# Altium footprint library PcbLib_ICs.PcbLib: 317 footprints (part 22 of 24)
Each footprint in its own frame and in the unit in brackets; x right, y up, seen from the top. Pads: shape width x height; smd on the part's side, far side on the other; paste and mask are expansions set on the pad; w line width, h text height; cw(c..) or ccw(c..) is an arc to the next point about the centre after c.
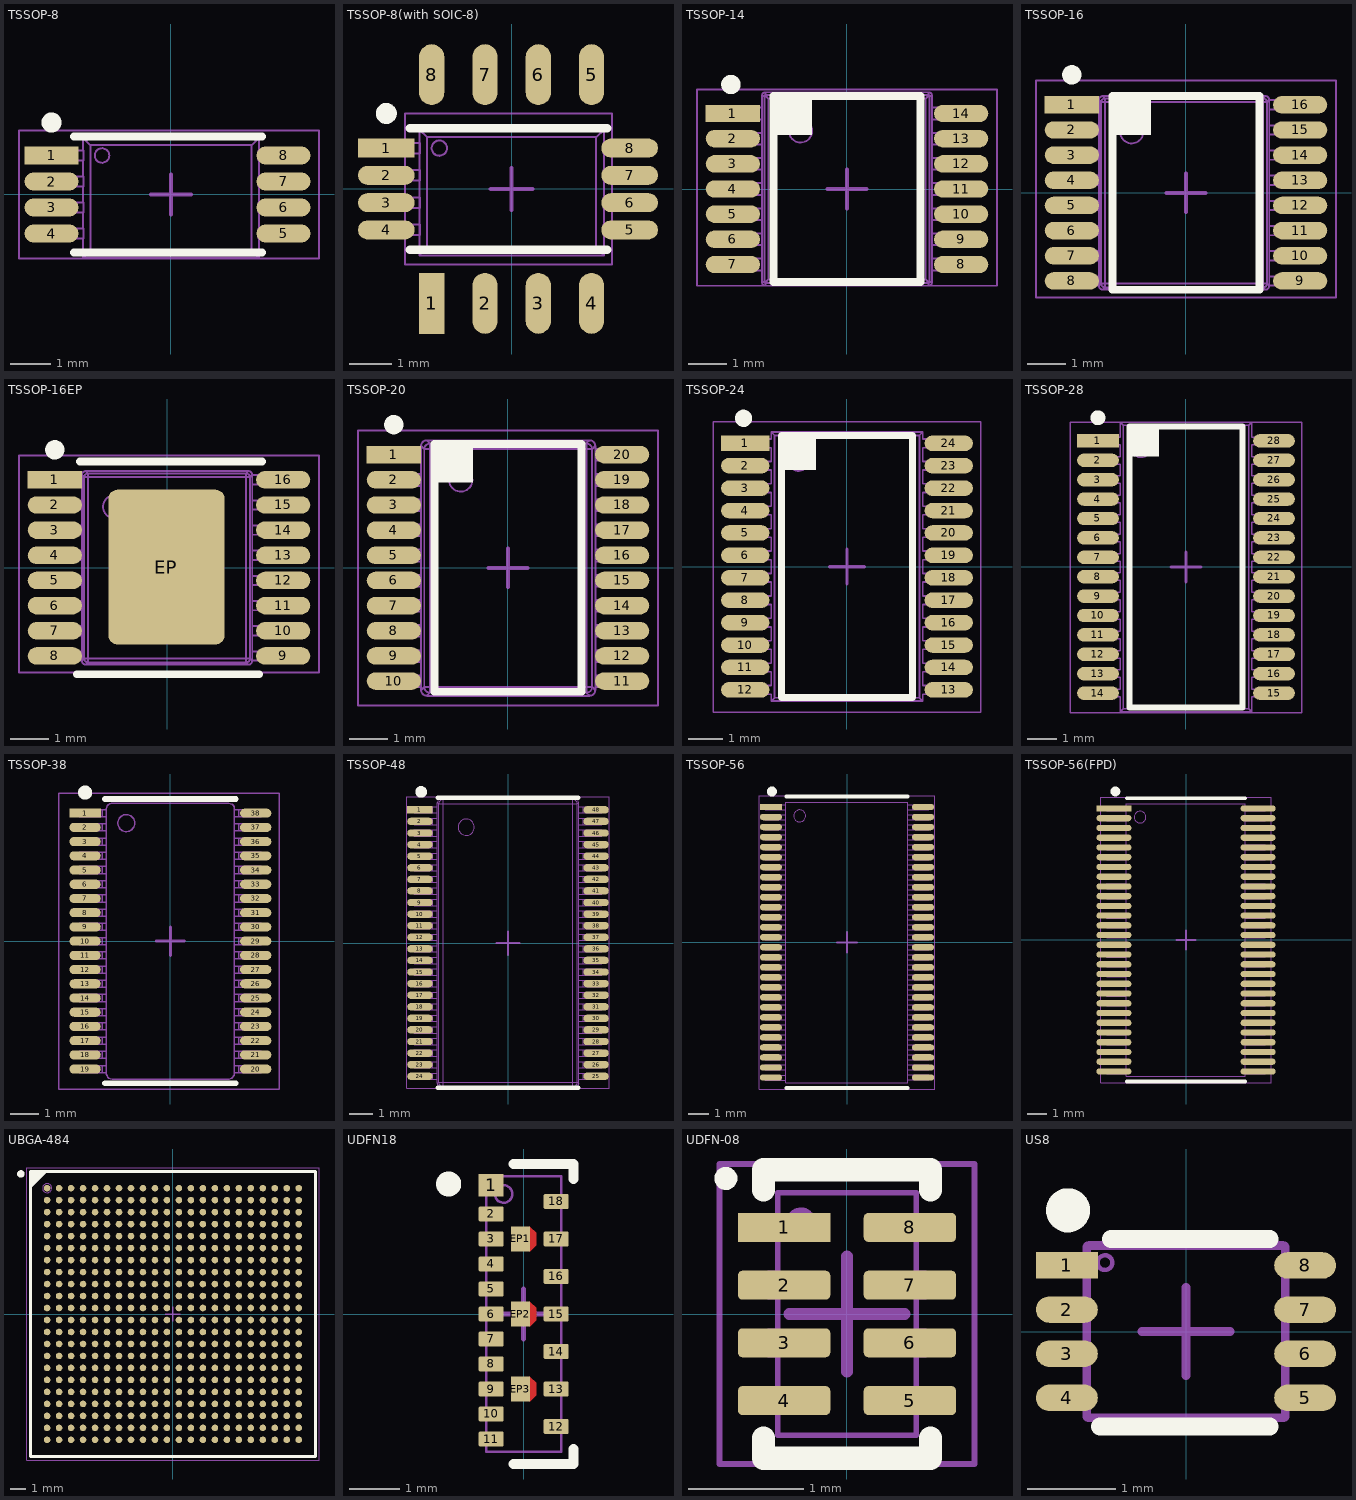
[diagram p21: the footprints below, top view; thin cyan lines are the x and y axes]

## TSSOP-8 [mm] "TSOP, 8-Leads, Body 3,00x3,00mm, Pitch 0,65mm, IPC Medium Density"
height 1.1
pads (8):
  rect 1.35x0.45 smd paste+0 mask+0.05: 1(-2.987,0.975)
  oval 1.35x0.45 smd paste+0 mask+0.05: 2(-2.987,0.325) 3(-2.987,-0.325) 4(-2.987,-0.975) 5(2.813,-0.975) 6(2.813,-0.325) 7(2.813,0.325) 8(2.813,0.975)
Top Overlay:
  circle w0.25: c-2.987,1.8 r0.125
  lines w0.2: -2.425,-1.45 2.275,-1.45 ; -2.425,1.45 2.275,1.45
Top Assy:
  circle w0.05: c-1.725,0.975 r0.182
  lines w0.05: -2.2,-1.1 -2.2,-1.581 ; -2.2,-0.85 -2.2,-0.45 ; -2.2,-0.2 -2.2,0.2 ; -2.2,0.45 -2.2,0.85 ; -2.2,1.1 -2.2,1.419 ; 2.2,-1.1 2.2,-1.581 ; 2.2,-0.85 2.2,-0.45 ; 2.2,-0.2 2.2,0.2 ; 2.2,0.45 2.2,0.85 ; 2.2,1.1 2.2,1.419 ; -2.718,-1.1 -2.718,-0.85 ; -2.718,-1.1 -3.14,-1.1 -3.14,-0.85 -2.718,-0.85 ; -2.718,-1.1 -2.642,-1.1 ; -2.718,-0.85 -2.642,-0.85 ; -2.718,-0.45 -2.718,-0.2 ; -2.718,-0.45 -3.14,-0.45 -3.14,-0.2 -2.718,-0.2 ; -2.718,-0.45 -2.642,-0.45 ; -2.718,-0.2 -2.642,-0.2 ; -2.718,0.2 -2.718,0.45 ; -2.718,0.2 -3.14,0.2 -3.14,0.45 -2.718,0.45 ; -2.718,0.2 -2.642,0.2 ; -2.718,0.45 -2.642,0.45 ; -2.718,0.85 -2.718,1.1 ; -2.718,0.85 -3.14,0.85 -3.14,1.1 -2.718,1.1 ; -2.718,0.85 -2.642,0.85 ; -2.718,1.1 -2.642,1.1 ; -2.642,-1.1 -2.642,-0.85 ; -2.642,-1.1 -2.362,-1.1 ; -2.642,-0.85 -2.362,-0.85 ; -2.642,-0.45 -2.362,-0.45 ; -2.642,-0.45 -2.642,-0.2 ; -2.642,-0.2 -2.362,-0.2 ; -2.642,0.2 -2.362,0.2 ; -2.642,0.2 -2.642,0.45 ; -2.642,0.45 -2.362,0.45 ; -2.642,0.85 -2.642,1.1 ; -2.642,0.85 -2.362,0.85 ; -2.642,1.1 -2.362,1.1 ; -2.362,-1.1 -2.362,-0.85 ; -2.362,-1.1 -2.191,-1.1 -2.191,-0.85 -2.362,-0.85 ; -2.362,-0.45 -2.362,-0.2 ; -2.362,-0.45 -2.191,-0.45 -2.191,-0.2 -2.362,-0.2 ; -2.362,0.2 -2.362,0.45 ; -2.362,0.2 -2.191,0.2 -2.191,0.45 -2.362,0.45 ; -2.362,0.85 -2.362,1.1 ; -2.362,0.85 -2.191,0.85 -2.191,1.1 -2.362,1.1 ; -2.2,-1.581 -2.015,-1.396 ; -2.2,-1.581 2.2,-1.581 ; -2.2,1.419 2.2,1.419 ; -2.2,1.419 -2.015,1.235 ; -2.015,-1.396 -2.015,1.235 ; -2.015,-1.396 2.015,-1.396 ; -2.015,1.235 2.015,1.235 ; 2.015,-1.396 2.015,1.235 ; 2.015,-1.396 2.2,-1.581 ; 2.015,1.235 2.2,1.419 ; 2.362,-1.1 2.362,-0.85 ; 2.362,-1.1 2.642,-1.1 ; 2.362,-1.1 2.191,-1.1 2.191,-0.85 2.362,-0.85 ; 2.362,-0.85 2.642,-0.85 ; 2.362,-0.45 2.362,-0.2 ; 2.362,-0.45 2.642,-0.45 ; 2.362,-0.45 2.191,-0.45 2.191,-0.2 2.362,-0.2 ; 2.362,-0.2 2.642,-0.2 ; 2.362,0.2 2.362,0.45 ; 2.362,0.2 2.642,0.2 ; 2.362,0.2 2.191,0.2 2.191,0.45 2.362,0.45 ; 2.362,0.45 2.642,0.45 ; 2.362,0.85 2.362,1.1 ; 2.362,0.85 2.191,0.85 2.191,1.1 2.362,1.1 ; 2.362,0.85 2.642,0.85 ; 2.362,1.1 2.642,1.1 ; 2.642,-1.1 2.718,-1.1 ; 2.642,-1.1 2.642,-0.85 ; 2.642,-0.85 2.718,-0.85 ; 2.642,-0.45 2.718,-0.45 ; 2.642,-0.45 2.642,-0.2 ; 2.642,-0.2 2.718,-0.2 ; 2.642,0.2 2.718,0.2 ; 2.642,0.2 2.642,0.45 ; 2.642,0.45 2.718,0.45 ; 2.642,0.85 2.718,0.85 ; 2.642,0.85 2.642,1.1 ; 2.642,1.1 2.718,1.1 ; 2.718,-1.1 2.718,-0.85 ; 2.718,-1.1 3.14,-1.1 3.14,-0.85 2.718,-0.85 ; 2.718,-0.45 2.718,-0.2 ; 2.718,-0.45 3.14,-0.45 3.14,-0.2 2.718,-0.2 ; 2.718,0.2 2.718,0.45 ; 2.718,0.2 3.14,0.2 3.14,0.45 2.718,0.45 ; 2.718,0.85 2.718,1.1 ; 2.718,0.85 3.14,0.85 3.14,1.1 2.718,1.1
  text ".Designator" at -2.579,-0.349 h1.5
Top Text:
  lines w0.05: -3.8,-1.6 -3.8,1.6 3.7,1.6 3.7,-1.6 -3.8,-1.6
  lines w0.1: -0.5,0 0.5,0 ; 0,-0.5 0,0.5
3D body "TSSOP-08.stp": height 1.11, standoff 0.01, extent -3.316,-1.249 3.114,1.25

## TSSOP-8(with SOIC-8) [mm] "TSOP, 8-Leads, Body 3,00x3,00mm, Pitch 0,65mm, IPC Medium Density"
height 1.1
pads (16):
  rect 1.35x0.45 smd paste+0 mask+0.05: 1(-2.987,0.975)
  rect 0.6x1.45 smd paste+0 mask+0.05: 1(-1.905,-2.725)
  oval 1.35x0.45 smd paste+0 mask+0.05: 2(-2.987,0.325) 3(-2.987,-0.325) 4(-2.987,-0.975) 5(2.813,-0.975) 6(2.813,-0.325) 7(2.813,0.325) 8(2.813,0.975)
  oval 0.6x1.45 smd paste+0 mask+0.05: 2(-0.635,-2.725) 3(0.635,-2.725) 4(1.905,-2.725) 5(1.905,2.725) 6(0.635,2.725) 7(-0.635,2.725) 8(-1.905,2.725)
Top Overlay:
  circle w0.25: c-2.987,1.8 r0.125
  lines w0.2: -2.425,-1.45 2.275,-1.45 ; -2.425,1.45 2.275,1.45
Top Assy:
  circle w0.05: c-1.725,0.975 r0.182
  lines w0.05: -2.2,-1.1 -2.2,-1.581 ; -2.2,-0.85 -2.2,-0.45 ; -2.2,-0.2 -2.2,0.2 ; -2.2,0.45 -2.2,0.85 ; -2.2,1.1 -2.2,1.419 ; 2.2,-1.1 2.2,-1.581 ; 2.2,-0.85 2.2,-0.45 ; 2.2,-0.2 2.2,0.2 ; 2.2,0.45 2.2,0.85 ; 2.2,1.1 2.2,1.419 ; -2.718,-1.1 -2.718,-0.85 ; -2.718,-1.1 -3.14,-1.1 -3.14,-0.85 -2.718,-0.85 ; -2.718,-1.1 -2.642,-1.1 ; -2.718,-0.85 -2.642,-0.85 ; -2.718,-0.45 -2.718,-0.2 ; -2.718,-0.45 -3.14,-0.45 -3.14,-0.2 -2.718,-0.2 ; -2.718,-0.45 -2.642,-0.45 ; -2.718,-0.2 -2.642,-0.2 ; -2.718,0.2 -2.718,0.45 ; -2.718,0.2 -3.14,0.2 -3.14,0.45 -2.718,0.45 ; -2.718,0.2 -2.642,0.2 ; -2.718,0.45 -2.642,0.45 ; -2.718,0.85 -2.718,1.1 ; -2.718,0.85 -3.14,0.85 -3.14,1.1 -2.718,1.1 ; -2.718,0.85 -2.642,0.85 ; -2.718,1.1 -2.642,1.1 ; -2.642,-1.1 -2.642,-0.85 ; -2.642,-1.1 -2.362,-1.1 ; -2.642,-0.85 -2.362,-0.85 ; -2.642,-0.45 -2.362,-0.45 ; -2.642,-0.45 -2.642,-0.2 ; -2.642,-0.2 -2.362,-0.2 ; -2.642,0.2 -2.362,0.2 ; -2.642,0.2 -2.642,0.45 ; -2.642,0.45 -2.362,0.45 ; -2.642,0.85 -2.642,1.1 ; -2.642,0.85 -2.362,0.85 ; -2.642,1.1 -2.362,1.1 ; -2.362,-1.1 -2.362,-0.85 ; -2.362,-1.1 -2.191,-1.1 -2.191,-0.85 -2.362,-0.85 ; -2.362,-0.45 -2.362,-0.2 ; -2.362,-0.45 -2.191,-0.45 -2.191,-0.2 -2.362,-0.2 ; -2.362,0.2 -2.362,0.45 ; -2.362,0.2 -2.191,0.2 -2.191,0.45 -2.362,0.45 ; -2.362,0.85 -2.362,1.1 ; -2.362,0.85 -2.191,0.85 -2.191,1.1 -2.362,1.1 ; -2.2,-1.581 -2.015,-1.396 ; -2.2,-1.581 2.2,-1.581 ; -2.2,1.419 2.2,1.419 ; -2.2,1.419 -2.015,1.235 ; -2.015,-1.396 -2.015,1.235 ; -2.015,-1.396 2.015,-1.396 ; -2.015,1.235 2.015,1.235 ; 2.015,-1.396 2.015,1.235 ; 2.015,-1.396 2.2,-1.581 ; 2.015,1.235 2.2,1.419 ; 2.362,-1.1 2.362,-0.85 ; 2.362,-1.1 2.642,-1.1 ; 2.362,-1.1 2.191,-1.1 2.191,-0.85 2.362,-0.85 ; 2.362,-0.85 2.642,-0.85 ; 2.362,-0.45 2.362,-0.2 ; 2.362,-0.45 2.642,-0.45 ; 2.362,-0.45 2.191,-0.45 2.191,-0.2 2.362,-0.2 ; 2.362,-0.2 2.642,-0.2 ; 2.362,0.2 2.362,0.45 ; 2.362,0.2 2.642,0.2 ; 2.362,0.2 2.191,0.2 2.191,0.45 2.362,0.45 ; 2.362,0.45 2.642,0.45 ; 2.362,0.85 2.362,1.1 ; 2.362,0.85 2.191,0.85 2.191,1.1 2.362,1.1 ; 2.362,0.85 2.642,0.85 ; 2.362,1.1 2.642,1.1 ; 2.642,-1.1 2.718,-1.1 ; 2.642,-1.1 2.642,-0.85 ; 2.642,-0.85 2.718,-0.85 ; 2.642,-0.45 2.718,-0.45 ; 2.642,-0.45 2.642,-0.2 ; 2.642,-0.2 2.718,-0.2 ; 2.642,0.2 2.718,0.2 ; 2.642,0.2 2.642,0.45 ; 2.642,0.45 2.718,0.45 ; 2.642,0.85 2.718,0.85 ; 2.642,0.85 2.642,1.1 ; 2.642,1.1 2.718,1.1 ; 2.718,-1.1 2.718,-0.85 ; 2.718,-1.1 3.14,-1.1 3.14,-0.85 2.718,-0.85 ; 2.718,-0.45 2.718,-0.2 ; 2.718,-0.45 3.14,-0.45 3.14,-0.2 2.718,-0.2 ; 2.718,0.2 2.718,0.45 ; 2.718,0.2 3.14,0.2 3.14,0.45 2.718,0.45 ; 2.718,0.85 2.718,1.1 ; 2.718,0.85 3.14,0.85 3.14,1.1 2.718,1.1
  text ".Designator" at -2.579,-0.349 h1.5
Top Text:
  lines w0.05: -2.54,-1.8 2.388,-1.8 2.388,1.8 -2.54,1.8 -2.54,-1.8
  lines w0.1: -0.5,0 0.5,0 ; 0,-0.5 0,0.5
3D body "TSSOP-08.stp": height 1.11, standoff 0.01, extent -3.316,-1.249 3.114,1.25

## TSSOP-14 [mm] "TSOP, 20-Leads, Body 6.50x4.40mm, Pitch 0.65mm, IPC Medium Density"
height 1.1
pads (14):
  rect 1.4x0.45 smd paste+0 mask+0.05: 1(-2.95,1.95)
  oval 1.4x0.45 smd paste+0 mask+0.05: 2(-2.95,1.3) 3(-2.95,0.65) 4(-2.95,0) 5(-2.95,-0.65) 6(-2.95,-1.3) 7(-2.95,-1.95) 8(2.95,-1.95) 9(2.95,-1.3) 10(2.95,-0.65) 11(2.95,0) 12(2.95,0.65) 13(2.95,1.3) 14(2.95,1.95)
Top Overlay:
  circle w0.25: c-3,2.7 r0.125
  region: -0.9,2.4 -1.9,2.4 -1.9,1.4 -0.9,1.4
  lines w0.2: -1.9,-2.4 1.9,-2.4 1.9,2.4 -1.9,2.4 -1.9,-2.4
Top Assy:
  drawing of 226 lines, arcs and shapes, not listed
  text ".Designator" at 0.467,-3.443 h2
Top Text:
  lines w0.05: -3.875,-2.5 3.875,-2.5 3.875,2.575 -3.875,2.575 -3.875,-2.5
  lines w0.1: -0.5,0 0.5,0 ; 0,-0.5 0,0.5
3D body "TSSOP-14.stp": height 1.11, standoff 0.01, extent -3.215,-2.225 3.216,2.225

## TSSOP-16 [mm] "TSOP, 20-Leads, Body 6.50x4.40mm, Pitch 0.65mm, IPC Medium Density"
height 1.1
pads (16):
  rect 1.4x0.45 smd paste+0 mask+0.05: 1(-2.95,2.275)
  oval 1.4x0.45 smd paste+0 mask+0.05: 2(-2.95,1.625) 3(-2.95,0.975) 4(-2.95,0.325) 5(-2.95,-0.325) 6(-2.95,-0.975) 7(-2.95,-1.625) 8(-2.95,-2.275) 9(2.95,-2.275) 10(2.95,-1.625) 11(2.95,-0.975) 12(2.95,-0.325) 13(2.95,0.325) 14(2.95,0.975) 15(2.95,1.625) 16(2.95,2.275)
Top Overlay:
  circle w0.25: c-2.95,3.05 r0.125
  region: -0.9,2.5 -1.9,2.5 -1.9,1.5 -0.9,1.5
  lines w0.2: -1.9,-2.5 1.9,-2.5 1.9,2.5 -1.9,2.5 -1.9,-2.5
Top Assy:
  drawing of 271 lines, arcs and shapes, not listed
  text ".Designator" at 0.467,-3.443 h2
Top Text:
  lines w0.05: -3.875,-2.7 3.875,-2.7 3.875,2.9 -3.875,2.9 -3.875,-2.7
  lines w0.1: -0.5,0 0.5,0 ; 0,-0.5 0,0.5
3D body "TSSOP-16.stp": height 1.11, standoff 0.01, extent -3.19,-2.55 3.241,2.55

## TSSOP-16EP [mm] "TSOP, 20-Leads, Body 6.50x4.40mm, Pitch 0.65mm, IPC Medium Density"
height 1.1
pads (17):
  rect 1.4x0.45 smd paste+0 mask+0.05: 1(-2.9,2.275)
  oval 1.4x0.45 smd paste+0 mask+0.05: 2(-2.9,1.625) 3(-2.9,0.975) 4(-2.9,0.325) 5(-2.9,-0.325) 6(-2.9,-0.975) 7(-2.9,-1.625) 8(-2.9,-2.275) 9(3,-2.275) 10(3,-1.625) 11(3,-0.975) 12(3,-0.325) 13(3,0.325) 14(3,0.975) 15(3,1.625) 16(3,2.275)
  rrect15% 3x4 smd paste-50 mask+0.05: EP(-0.015,0.02)
Top Overlay:
  circle w0.25: c-2.9,3.05 r0.125
  lines w0.2: -2.325,-2.75 2.375,-2.75 ; -2.25,2.75 2.45,2.75
Top Paste:
  region: 0.1,0.6 0.1,0.1 0.6,0.1 0.6,0.6
  region: -0.6,0.6 -0.6,0.1 -0.1,0.1 -0.1,0.6
  region: -0.1,-0.6 -0.1,-0.1 -0.6,-0.1 -0.6,-0.6
  region: 0.6,-0.6 0.6,-0.1 0.1,-0.1 0.1,-0.6
  region: -1.3,0.6 -1.3,0.1 -0.8,0.1 -0.8,0.6
  region: -0.8,-0.6 -0.8,-0.1 -1.3,-0.1 -1.3,-0.6
  region: 1.3,-0.6 1.3,-0.1 0.8,-0.1 0.8,-0.6
  region: 0.8,0.6 0.8,0.1 1.3,0.1 1.3,0.6
  region: 0.1,1.3 0.1,0.8 0.6,0.8 0.6,1.3
  region: -0.6,1.3 -0.6,0.8 -0.1,0.8 -0.1,1.3
  region: -1.3,1.3 -1.3,0.8 -0.8,0.8 -0.8,1.3
  region: 0.8,1.3 0.8,0.8 1.3,0.8 1.3,1.3
  region: 0.1,2 0.1,1.5 0.6,1.5 0.6,2
  region: -0.6,2 -0.6,1.5 -0.1,1.5 -0.1,2
  region: -1.3,2 -1.3,1.5 -0.8,1.5 -0.8,2
  region: 0.8,2 0.8,1.5 1.3,1.5 1.3,2
  region: -0.1,-1.3 -0.1,-0.8 -0.6,-0.8 -0.6,-1.3
  region: 0.6,-1.3 0.6,-0.8 0.1,-0.8 0.1,-1.3
  region: 1.3,-1.3 1.3,-0.8 0.8,-0.8 0.8,-1.3
  region: -0.8,-1.3 -0.8,-0.8 -1.3,-0.8 -1.3,-1.3
  region: -0.1,-2 -0.1,-1.5 -0.6,-1.5 -0.6,-2
  region: 0.6,-2 0.6,-1.5 0.1,-1.5 0.1,-2
  region: 1.3,-2 1.3,-1.5 0.8,-1.5 0.8,-2
  region: -0.8,-2 -0.8,-1.5 -1.3,-1.5 -1.3,-2
Top Assy:
  drawing of 271 lines, arcs and shapes, not listed
  text ".Designator" at 0.467,-3.443 h2
Top Text:
  lines w0.05: -3.825,-2.7 3.925,-2.7 3.925,2.9 -3.825,2.9 -3.825,-2.7
  lines w0.1: -0.5,0 0.5,0 ; 0,-0.5 0,0.5
3D body "User Library-AS3933-BTST.step": height 1.06, standoff -0.01, extent -3.175,-2.55 3.325,2.55

## TSSOP-20 [mm] "TSOP, 20-Leads, Body 6.50x4.40mm, Pitch 0.65mm, IPC Medium Density"
height 1.1
pads (20):
  rect 1.4x0.45 smd paste+0 mask+0.05: 1(-2.95,2.925)
  oval 1.4x0.45 smd paste+0 mask+0.05: 2(-2.95,2.275) 3(-2.95,1.625) 4(-2.95,0.975) 5(-2.95,0.325) 6(-2.95,-0.325) 7(-2.95,-0.975) 8(-2.95,-1.625) 9(-2.95,-2.275) 10(-2.95,-2.925) 11(2.95,-2.925) 12(2.95,-2.275) 13(2.95,-1.625) 14(2.95,-0.975) 15(2.95,-0.325) 16(2.95,0.325) 17(2.95,0.975) 18(2.95,1.625) 19(2.95,2.275) 20(2.95,2.925)
Top Overlay:
  circle w0.25: c-2.95,3.7 r0.125
  region: -0.9,3.2 -1.9,3.2 -1.9,2.2 -0.9,2.2
  lines w0.2: -1.9,-3.2 -1.9,3.2 1.9,3.2 1.9,-3.2 -1.9,-3.2
Top Assy:
  drawing of 315 lines, arcs and shapes, not listed
  text ".Designator" at 0.349,-2.579 h1.5
Top Text:
  lines w0.05: -3.875,-3.55 3.875,-3.55 3.875,3.55 -3.875,3.55 -3.875,-3.55
  lines w0.1: -0.5,0 0.5,0 ; 0,-0.5 0,0.5
3D body "TSSOP-20.stp": height 1.11, standoff 0.01, extent -3.215,-3.2 3.216,3.2

## TSSOP-24 [mm] "TSOP, 24-Leads, Pitch 0.65mm, IPC Medium Density"
height 1.1
pads (24):
  rect 1.4x0.45 smd paste+0 mask+0.05: 1(-2.95,3.575)
  oval 1.4x0.45 smd paste+0 mask+0.05: 2(-2.95,2.925) 3(-2.95,2.275) 4(-2.95,1.625) 5(-2.95,0.975) 6(-2.95,0.325) 7(-2.95,-0.325) 8(-2.95,-0.975) 9(-2.95,-1.625) 10(-2.95,-2.275) 11(-2.95,-2.925) 12(-2.95,-3.575) 13(2.95,-3.575) 14(2.95,-2.925) 15(2.95,-2.275) 16(2.95,-1.625) 17(2.95,-0.975) 18(2.95,-0.325) 19(2.95,0.325) 20(2.95,0.975) 21(2.95,1.625) 22(2.95,2.275) 23(2.95,2.925) 24(2.95,3.575)
Top Overlay:
  circle w0.25: c-3,4.3 r0.125
  region: -0.9,3.8 -1.9,3.8 -1.9,2.8 -0.9,2.8
  lines w0.2: -1.9,-3.8 1.9,-3.8 1.9,3.8 -1.9,3.8 -1.9,-3.8
Top Assy:
  drawing of 397 lines, arcs and shapes, not listed
  text ".Designator" at 0.467,-3.443 h2
Top Text:
  lines w0.05: -3.875,-4.225 3.875,-4.225 3.875,4.2 -3.875,4.2 -3.875,-4.225
  lines w0.1: -0.5,0 0.5,0 ; 0,-0.5 0,0.5
3D body "TSSOP-24.stp": height 1.11, standoff 0.01, extent -3.215,-3.85 3.216,3.85

## TSSOP-28 [mm] "TSOP, 28-Leads, Pitch 0.65mm, IPC Medium Density"
height 1.1
pads (28):
  rect 1.4x0.45 smd paste+0 mask+0.05: 1(-2.95,4.225)
  oval 1.4x0.45 smd paste+0 mask+0.05: 2(-2.95,3.575) 3(-2.95,2.925) 4(-2.95,2.275) 5(-2.95,1.625) 6(-2.95,0.975) 7(-2.95,0.325) 8(-2.95,-0.325) 9(-2.95,-0.975) 10(-2.95,-1.625) 11(-2.95,-2.275) 12(-2.95,-2.925) 13(-2.95,-3.575) 14(-2.95,-4.225) 15(2.95,-4.225) 16(2.95,-3.575) 17(2.95,-2.925) 18(2.95,-2.275) 19(2.95,-1.625) 20(2.95,-0.975) 21(2.95,-0.325) 22(2.95,0.325) 23(2.95,0.975) 24(2.95,1.625) 25(2.95,2.275) 26(2.95,2.925) 27(2.95,3.575) 28(2.95,4.225)
Top Overlay:
  circle w0.25: c-2.95,5 r0.125
  region: -0.9,4.7 -1.9,4.7 -1.9,3.7 -0.9,3.7
  lines w0.2: -1.9,-4.7 1.9,-4.7 1.9,4.7 -1.9,4.7 -1.9,-4.7
Top Assy:
  drawing of 461 lines, arcs and shapes, not listed
  text ".Designator" at 0.467,-3.443 h2
Top Text:
  lines w0.05: -3.875,-4.875 -3.875,4.85 3.875,4.85 3.875,-4.875 -3.875,-4.875
  lines w0.1: -0.5,0 0.5,0 ; 0,-0.5 0,0.5
3D body "TSSOP-28.stp": height 1.11, standoff 0.01, extent -3.215,-4.5 3.216,4.5

## TSSOP-38 [mm] "TSSOP, 38-Leads, Pitch 0.5mm, IPC Medium Density"
height 1.1
pads (38):
  rect 1.1x0.32 smd paste+0 mask+0.05: 1(-3,4.5)
  oval 1.1x0.32 smd paste+0 mask+0.05: 2(-3,4) 3(-3,3.5) 4(-3,3) 5(-3,2.5) 6(-3,2) 7(-3,1.5) 8(-3,1) 9(-3,0.5) 10(-3,0) 11(-3,-0.5) 12(-3,-1) 13(-3,-1.5) 14(-3,-2) 15(-3,-2.5) 16(-3,-3) 17(-3,-3.5) 18(-3,-4) 19(-3,-4.5) 20(3,-4.5) 21(3,-4) 22(3,-3.5) 23(3,-3) 24(3,-2.5) 25(3,-2) 26(3,-1.5) 27(3,-1) 28(3,-0.5) 29(3,0) 30(3,0.5) 31(3,1) 32(3,1.5) 33(3,2) 34(3,2.5) 35(3,3) 36(3,3.5) 37(3,4) 38(3,4.5)
Top Overlay:
  circle w0.25: c-3,5.225 r0.125
  lines w0.2: -2.3,-5 2.3,-5 ; -2.3,5 2.3,5
Top Assy:
  drawing of 942 lines, arcs and shapes, not listed
  text ".Designator" at 0.467,-3.443 h2
Top Text:
  lines w0.05: -3.925,-5.2 3.825,-5.2 3.825,5.2 -3.925,5.2 -3.925,-5.2
  lines w0.1: -0.5,0 0.5,0 ; 0,-0.5 0,0.5
3D body "TSSOP-38.stp": height 1.11, standoff 0.01, extent -3.215,-5 3.215,5

## TSSOP-48 [mm] "TSSOP, 48-Leads, Pitch 0.5mm, IPC Medium Density"
height 1.1
pads (48):
  rect 1.1x0.32 smd paste+0 mask+0.05: 1(-3.8,5.75)
  oval 1.1x0.32 smd paste+0 mask+0.05: 2(-3.8,5.25) 3(-3.8,4.75) 4(-3.8,4.25) 5(-3.8,3.75) 6(-3.8,3.25) 7(-3.8,2.75) 8(-3.8,2.25) 9(-3.8,1.75) 10(-3.8,1.25) 11(-3.8,0.75) 12(-3.8,0.25) 13(-3.8,-0.25) 14(-3.8,-0.75) 15(-3.8,-1.25) 16(-3.8,-1.75) 17(-3.8,-2.25) 18(-3.8,-2.75) 19(-3.8,-3.25) 20(-3.8,-3.75) 21(-3.8,-4.25) 22(-3.8,-4.75) 23(-3.8,-5.25) 24(-3.8,-5.75) 25(3.8,-5.75) 26(3.8,-5.25) 27(3.8,-4.75) 28(3.8,-4.25) 29(3.8,-3.75) 30(3.8,-3.25) 31(3.8,-2.75) 32(3.8,-2.25) 33(3.8,-1.75) 34(3.8,-1.25) 35(3.8,-0.75) 36(3.8,-0.25) 37(3.8,0.25) 38(3.8,0.75) 39(3.8,1.25) 40(3.8,1.75) 41(3.8,2.25) 42(3.8,2.75) 43(3.8,3.25) 44(3.8,3.75) 45(3.8,4.25) 46(3.8,4.75) 47(3.8,5.25) 48(3.8,5.75)
Top Overlay:
  circle w0.25: c-3.75,6.525 r0.125
  lines w0.2: -3.025,-6.25 3.025,-6.25 ; -3.025,6.275 3.025,6.275
Top Assy:
  drawing of 717 lines, arcs and shapes, not listed
  text ".Designator" at 0.467,-3.443 h2
Top Text:
  lines w0.05: -4.375,-6.275 -4.375,6.325 4.375,6.325 4.375,-6.275 -4.375,-6.275
  lines w0.1: -0.5,0 0.5,0 ; 0,-0.5 0,0.5
3D body "TSSOP-48.stp": height 1.11, standoff 0.01, extent -4.065,-6.25 4.065,6.25

## TSSOP-56 [mm] "TSSOP, 56-Leads, Pitch 0.5mm, IPC Medium Density"
height 1.1
pads (56):
  rect 1.1x0.32 smd paste+0 mask+0.05: 1(-3.8,6.75)
  oval 1.1x0.32 smd paste+0 mask+0.05: 2(-3.8,6.25) 3(-3.8,5.75) 4(-3.8,5.25) 5(-3.8,4.75) 6(-3.8,4.25) 7(-3.8,3.75) 8(-3.8,3.25) 9(-3.8,2.75) 10(-3.8,2.25) 11(-3.8,1.75) 12(-3.8,1.25) 13(-3.8,0.75) 14(-3.8,0.25) 15(-3.8,-0.25) 16(-3.8,-0.75) 17(-3.8,-1.25) 18(-3.8,-1.75) 19(-3.8,-2.25) 20(-3.8,-2.75) 21(-3.8,-3.25) 22(-3.8,-3.75) 23(-3.8,-4.25) 24(-3.8,-4.75) 25(-3.8,-5.25) 26(-3.8,-5.75) 27(-3.8,-6.25) 28(-3.8,-6.75) 29(3.8,-6.75) 30(3.8,-6.25) 31(3.8,-5.75) 32(3.8,-5.25) 33(3.8,-4.75) 34(3.8,-4.25) 35(3.8,-3.75) 36(3.8,-3.25) 37(3.8,-2.75) 38(3.8,-2.25) 39(3.8,-1.75) 40(3.8,-1.25) 41(3.8,-0.75) 42(3.8,-0.25) 43(3.8,0.25) 44(3.8,0.75) 45(3.8,1.25) 46(3.8,1.75) 47(3.8,2.25) 48(3.8,2.75) 49(3.8,3.25) 50(3.8,3.75) 51(3.8,4.25) 52(3.8,4.75) 53(3.8,5.25) 54(3.8,5.75) 55(3.8,6.25) 56(3.8,6.75)
Top Overlay:
  circle w0.25: c-3.75,7.525 r0.125
  lines w0.2: -3.025,-7.275 3.025,-7.275 ; -3.025,7.275 3.025,7.275
Top Assy:
  drawing of 1349 lines, arcs and shapes, not listed
  text ".Designator" at 0.467,-3.443 h2
Top Text:
  lines w0.05: -4.375,-7.325 -4.375,7.325 4.375,7.325 4.375,-7.325 -4.375,-7.325
  lines w0.1: -0.5,0 0.5,0 ; 0,-0.5 0,0.5
3D body "TSSOP-56.stp": height 1.11, standoff 0.01, extent -4.065,-7.25 4.065,7.247

## TSSOP-56(FPD) [mm] "TSSOP, 56-Leads, Pitch 0.5mm, IPC Medium Density"
height 1.1
pads (56):
  rect 1.8x0.32 smd paste+0 mask+0.05: 1(-3.7,6.75)
  oval 1.8x0.32 smd paste+0 mask+0.05: 2(-3.7,6.25) 3(-3.7,5.75) 4(-3.7,5.25) 5(-3.7,4.75) 6(-3.7,4.25) 7(-3.7,3.75) 8(-3.7,3.25) 9(-3.7,2.75) 10(-3.7,2.25) 11(-3.7,1.75) 12(-3.7,1.25) 13(-3.7,0.75) 14(-3.7,0.25) 15(-3.7,-0.25) 16(-3.7,-0.75) 17(-3.7,-1.25) 18(-3.7,-1.75) 19(-3.7,-2.25) 20(-3.7,-2.75) 21(-3.7,-3.25) 22(-3.7,-3.75) 23(-3.7,-4.25) 24(-3.7,-4.75) 25(-3.7,-5.25) 26(-3.7,-5.75) 27(-3.7,-6.25) 28(-3.7,-6.75) 29(3.7,-6.75) 30(3.7,-6.25) 31(3.7,-5.75) 32(3.7,-5.25) 33(3.7,-4.75) 34(3.7,-4.25) 35(3.7,-3.75) 36(3.7,-3.25) 37(3.7,-2.75) 38(3.7,-2.25) 39(3.7,-1.75) 40(3.7,-1.25) 41(3.7,-0.75) 42(3.7,-0.25) 43(3.7,0.25) 44(3.7,0.75) 45(3.7,1.25) 46(3.7,1.75) 47(3.7,2.25) 48(3.7,2.75) 49(3.7,3.25) 50(3.7,3.75) 51(3.7,4.25) 52(3.7,4.75) 53(3.7,5.25) 54(3.7,5.75) 55(3.7,6.25) 56(3.7,6.75)
Top Overlay:
  circle w0.25: c-3.625,7.625 r0.125
  lines w0.2: -3.025,-7.275 3.025,-7.275 ; -3.025,7.275 3.025,7.275
Top Assy:
  drawing of 1349 lines, arcs and shapes, not listed
  text ".Designator" at 0.467,-3.443 h2
Top Text:
  lines w0.05: -4.375,-7.325 4.375,-7.325 4.375,7.325 -4.375,7.325 -4.375,-7.325
  lines w0.1: -0.5,0 0.5,0 ; 0,-0.5 0,0.5
3D body "TSSOP-56.stp": height 1.11, standoff 0.01, extent -4.065,-7.25 4.065,7.247

## UBGA-484 [mm] "UBGA-484 package with 0.8mm pitch"
height 2.2
pads (484):
  round 0.44 smd paste+0 mask+0.05: A1(-8.4,8.4) A2(-7.6,8.4) A3(-6.8,8.4) A4(-6,8.4) A5(-5.2,8.4) A6(-4.4,8.4) A7(-3.6,8.4) A8(-2.8,8.4) A9(-2,8.4) A10(-1.2,8.4) A11(-0.4,8.4) A12(0.4,8.4) A13(1.2,8.4) A14(2,8.4) A15(2.8,8.4) A16(3.6,8.4) A17(4.4,8.4) A18(5.2,8.4) A19(6,8.4) A20(6.8,8.4) A21(7.6,8.4) A22(8.4,8.4) AA1(-8.4,-7.6) AA2(-7.6,-7.6) AA3(-6.8,-7.6) AA4(-6,-7.6) AA5(-5.2,-7.6) AA6(-4.4,-7.6) AA7(-3.6,-7.6) AA8(-2.8,-7.6) AA9(-2,-7.6) AA10(-1.2,-7.6) AA11(-0.4,-7.6) AA12(0.4,-7.6) AA13(1.2,-7.6) AA14(2,-7.6) AA15(2.8,-7.6) AA16(3.6,-7.6) AA17(4.4,-7.6) AA18(5.2,-7.6) AA19(6,-7.6) AA20(6.8,-7.6) AA21(7.6,-7.6) AA22(8.4,-7.6) AB1(-8.4,-8.4) AB2(-7.6,-8.4) AB3(-6.8,-8.4) AB4(-6,-8.4) AB5(-5.2,-8.4) AB6(-4.4,-8.4) AB7(-3.6,-8.4) AB8(-2.8,-8.4) AB9(-2,-8.4) AB10(-1.2,-8.4) AB11(-0.4,-8.4) AB12(0.4,-8.4) AB13(1.2,-8.4) AB14(2,-8.4) AB15(2.8,-8.4) AB16(3.6,-8.4) AB17(4.4,-8.4) AB18(5.2,-8.4) AB19(6,-8.4) AB20(6.8,-8.4) AB21(7.6,-8.4) AB22(8.4,-8.4) B1(-8.4,7.6) B2(-7.6,7.6) B3(-6.8,7.6) B4(-6,7.6) B5(-5.2,7.6) B6(-4.4,7.6) B7(-3.6,7.6) B8(-2.8,7.6) B9(-2,7.6) B10(-1.2,7.6) B11(-0.4,7.6) B12(0.4,7.6) B13(1.2,7.6) B14(2,7.6) B15(2.8,7.6) B16(3.6,7.6) B17(4.4,7.6) B18(5.2,7.6) B19(6,7.6) B20(6.8,7.6) B21(7.6,7.6) B22(8.4,7.6) C1(-8.4,6.8) C2(-7.6,6.8) C3(-6.8,6.8) C4(-6,6.8) C5(-5.2,6.8) C6(-4.4,6.8) C7(-3.6,6.8) C8(-2.8,6.8) C9(-2,6.8) C10(-1.2,6.8) C11(-0.4,6.8) C12(0.4,6.8) C13(1.2,6.8) C14(2,6.8) C15(2.8,6.8) C16(3.6,6.8) C17(4.4,6.8) C18(5.2,6.8) C19(6,6.8) C20(6.8,6.8) C21(7.6,6.8) C22(8.4,6.8) D1(-8.4,6) D2(-7.6,6) D3(-6.8,6) D4(-6,6) D5(-5.2,6) D6(-4.4,6) D7(-3.6,6) D8(-2.8,6) D9(-2,6) D10(-1.2,6) D11(-0.4,6) D12(0.4,6) D13(1.2,6) D14(2,6) D15(2.8,6) D16(3.6,6) D17(4.4,6) D18(5.2,6) D19(6,6) D20(6.8,6) D21(7.6,6) D22(8.4,6) E1(-8.4,5.2) E2(-7.6,5.2) E3(-6.8,5.2) E4(-6,5.2) E5(-5.2,5.2) E6(-4.4,5.2) E7(-3.6,5.2) E8(-2.8,5.2) E9(-2,5.2) E10(-1.2,5.2) E11(-0.4,5.2) E12(0.4,5.2) E13(1.2,5.2) E14(2,5.2) E15(2.8,5.2) E16(3.6,5.2) E17(4.4,5.2) E18(5.2,5.2) E19(6,5.2) E20(6.8,5.2) E21(7.6,5.2) E22(8.4,5.2) F1(-8.4,4.4) F2(-7.6,4.4) F3(-6.8,4.4) F4(-6,4.4) F5(-5.2,4.4) F6(-4.4,4.4) F7(-3.6,4.4) F8(-2.8,4.4) F9(-2,4.4) F10(-1.2,4.4) F11(-0.4,4.4) F12(0.4,4.4) F13(1.2,4.4) F14(2,4.4) F15(2.8,4.4) F16(3.6,4.4) F17(4.4,4.4) F18(5.2,4.4) F19(6,4.4) F20(6.8,4.4) F21(7.6,4.4) F22(8.4,4.4) G1(-8.4,3.6) G2(-7.6,3.6) G3(-6.8,3.6) G4(-6,3.6) G5(-5.2,3.6) G6(-4.4,3.6) G7(-3.6,3.6) G8(-2.8,3.6) G9(-2,3.6) G10(-1.2,3.6) G11(-0.4,3.6) G12(0.4,3.6) G13(1.2,3.6) G14(2,3.6) G15(2.8,3.6) G16(3.6,3.6) G17(4.4,3.6) G18(5.2,3.6) G19(6,3.6) G20(6.8,3.6) G21(7.6,3.6) G22(8.4,3.6) H1(-8.4,2.8) H2(-7.6,2.8) H3(-6.8,2.8) H4(-6,2.8) H5(-5.2,2.8) H6(-4.4,2.8) H7(-3.6,2.8) H8(-2.8,2.8) H9(-2,2.8) H10(-1.2,2.8) H11(-0.4,2.8) H12(0.4,2.8) H13(1.2,2.8) H14(2,2.8) H15(2.8,2.8) H16(3.6,2.8) H17(4.4,2.8) H18(5.2,2.8) H19(6,2.8) H20(6.8,2.8) H21(7.6,2.8) H22(8.4,2.8) J1(-8.4,2) J2(-7.6,2) J3(-6.8,2) J4(-6,2) J5(-5.2,2) J6(-4.4,2) J7(-3.6,2) J8(-2.8,2) J9(-2,2) J10(-1.2,2) J11(-0.4,2) J12(0.4,2) J13(1.2,2) J14(2,2) J15(2.8,2) J16(3.6,2) J17(4.4,2) J18(5.2,2) J19(6,2) J20(6.8,2) J21(7.6,2) J22(8.4,2) K1(-8.4,1.2) K2(-7.6,1.2) K3(-6.8,1.2) K4(-6,1.2) K5(-5.2,1.2) K6(-4.4,1.2) K7(-3.6,1.2) K8(-2.8,1.2) K9(-2,1.2) K10(-1.2,1.2) K11(-0.4,1.2) K12(0.4,1.2) K13(1.2,1.2) K14(2,1.2) K15(2.8,1.2) K16(3.6,1.2) K17(4.4,1.2) K18(5.2,1.2) K19(6,1.2) K20(6.8,1.2) K21(7.6,1.2) K22(8.4,1.2) L1(-8.4,0.4) L2(-7.6,0.4) L3(-6.8,0.4) L4(-6,0.4) L5(-5.2,0.4) L6(-4.4,0.4) L7(-3.6,0.4) L8(-2.8,0.4) L9(-2,0.4) L10(-1.2,0.4) L11(-0.4,0.4) L12(0.4,0.4) L13(1.2,0.4) L14(2,0.4) L15(2.8,0.4) L16(3.6,0.4) L17(4.4,0.4) L18(5.2,0.4) L19(6,0.4) L20(6.8,0.4) L21(7.6,0.4) L22(8.4,0.4) M1(-8.4,-0.4) M2(-7.6,-0.4) M3(-6.8,-0.4) M4(-6,-0.4) M5(-5.2,-0.4) M6(-4.4,-0.4) M7(-3.6,-0.4) M8(-2.8,-0.4) M9(-2,-0.4) M10(-1.2,-0.4) M11(-0.4,-0.4) M12(0.4,-0.4) M13(1.2,-0.4) M14(2,-0.4) M15(2.8,-0.4) M16(3.6,-0.4) M17(4.4,-0.4) M18(5.2,-0.4) M19(6,-0.4) M20(6.8,-0.4) M21(7.6,-0.4) M22(8.4,-0.4) N1(-8.4,-1.2) N2(-7.6,-1.2) N3(-6.8,-1.2) N4(-6,-1.2) N5(-5.2,-1.2) N6(-4.4,-1.2) N7(-3.6,-1.2) N8(-2.8,-1.2) N9(-2,-1.2) N10(-1.2,-1.2) N11(-0.4,-1.2) N12(0.4,-1.2) N13(1.2,-1.2) N14(2,-1.2) N15(2.8,-1.2) N16(3.6,-1.2) N17(4.4,-1.2) N18(5.2,-1.2) N19(6,-1.2) N20(6.8,-1.2) N21(7.6,-1.2) N22(8.4,-1.2) P1(-8.4,-2) P2(-7.6,-2) P3(-6.8,-2) P4(-6,-2) P5(-5.2,-2) P6(-4.4,-2) P7(-3.6,-2) P8(-2.8,-2) P9(-2,-2) P10(-1.2,-2) P11(-0.4,-2) P12(0.4,-2) P13(1.2,-2) P14(2,-2) P15(2.8,-2) P16(3.6,-2) P17(4.4,-2) P18(5.2,-2) P19(6,-2) P20(6.8,-2) P21(7.6,-2) P22(8.4,-2) R1(-8.4,-2.8) R2(-7.6,-2.8) R3(-6.8,-2.8) R4(-6,-2.8) R5(-5.2,-2.8) R6(-4.4,-2.8) R7(-3.6,-2.8) R8(-2.8,-2.8) R9(-2,-2.8) R10(-1.2,-2.8) R11(-0.4,-2.8) R12(0.4,-2.8) R13(1.2,-2.8) R14(2,-2.8) R15(2.8,-2.8) R16(3.6,-2.8) R17(4.4,-2.8) R18(5.2,-2.8) R19(6,-2.8) R20(6.8,-2.8) R21(7.6,-2.8) R22(8.4,-2.8) T1(-8.4,-3.6) T2(-7.6,-3.6) T3(-6.8,-3.6) T4(-6,-3.6) T5(-5.2,-3.6) T6(-4.4,-3.6) T7(-3.6,-3.6) T8(-2.8,-3.6) T9(-2,-3.6) T10(-1.2,-3.6) T11(-0.4,-3.6) T12(0.4,-3.6) T13(1.2,-3.6) T14(2,-3.6) T15(2.8,-3.6) T16(3.6,-3.6) T17(4.4,-3.6) T18(5.2,-3.6) T19(6,-3.6) T20(6.8,-3.6) T21(7.6,-3.6) T22(8.4,-3.6) U1(-8.4,-4.4) U2(-7.6,-4.4) U3(-6.8,-4.4) U4(-6,-4.4) U5(-5.2,-4.4) U6(-4.4,-4.4) U7(-3.6,-4.4) U8(-2.8,-4.4) U9(-2,-4.4) U10(-1.2,-4.4) U11(-0.4,-4.4) U12(0.4,-4.4) U13(1.2,-4.4) U14(2,-4.4) U15(2.8,-4.4) U16(3.6,-4.4) U17(4.4,-4.4) U18(5.2,-4.4) U19(6,-4.4) U20(6.8,-4.4) U21(7.6,-4.4) U22(8.4,-4.4) V1(-8.4,-5.2) V2(-7.6,-5.2) V3(-6.8,-5.2) V4(-6,-5.2) V5(-5.2,-5.2) V6(-4.4,-5.2) V7(-3.6,-5.2) V8(-2.8,-5.2) V9(-2,-5.2) V10(-1.2,-5.2) V11(-0.4,-5.2) V12(0.4,-5.2) V13(1.2,-5.2) V14(2,-5.2) V15(2.8,-5.2) V16(3.6,-5.2) V17(4.4,-5.2) V18(5.2,-5.2) V19(6,-5.2) V20(6.8,-5.2) V21(7.6,-5.2) V22(8.4,-5.2) W1(-8.4,-6) W2(-7.6,-6) W3(-6.8,-6) W4(-6,-6) W5(-5.2,-6) W6(-4.4,-6) W7(-3.6,-6) W8(-2.8,-6) W9(-2,-6) W10(-1.2,-6) W11(-0.4,-6) W12(0.4,-6) W13(1.2,-6) W14(2,-6) W15(2.8,-6) W16(3.6,-6) W17(4.4,-6) W18(5.2,-6) W19(6,-6) W20(6.8,-6) W21(7.6,-6) W22(8.4,-6) Y1(-8.4,-6.8) Y2(-7.6,-6.8) Y3(-6.8,-6.8) Y4(-6,-6.8) Y5(-5.2,-6.8) Y6(-4.4,-6.8) Y7(-3.6,-6.8) Y8(-2.8,-6.8) Y9(-2,-6.8) Y10(-1.2,-6.8) Y11(-0.4,-6.8) Y12(0.4,-6.8) Y13(1.2,-6.8) Y14(2,-6.8) Y15(2.8,-6.8) Y16(3.6,-6.8) Y17(4.4,-6.8) Y18(5.2,-6.8) Y19(6,-6.8) Y20(6.8,-6.8) Y21(7.6,-6.8) Y22(8.4,-6.8)
Top Overlay:
  circle w0.25: c-10.15,9.35 r0.125
  region: -8.5,9.5 -9.5,8.5 -9.5,9.5
  lines w0.2: -9.5,8.5 -8.5,9.5 ; -9.5,-9.5 -9.5,9.5 9.5,9.5 9.5,-9.5 -9.5,-9.5
Top Assy:
  circle w0.05: c-8.4,8.4 r0.3
  lines w0.05: -9.5,-9.5 -9.5,9.5 9.5,9.5 9.5,-9.5 -9.5,-9.5
  text ".Designator" at -3.443,-0.467 h2
Top Text:
  lines w0.05: -9.75,-9.75 -9.75,9.75 9.75,9.75 9.75,-9.75 -9.75,-9.75
  lines w0.1: -0.5,0 0.5,0 ; 0,-0.5 0,0.5
3D body "UBGA-484.step": height 2.2, standoff 0, extent -9.5,-9.5 9.5,9.5

## UDFN18 [mm]
height 1.1
pads (21):
  rect 0.5x0.45 smd paste+0 mask+0.035: 1(-0.65,2.575)
  rrect20% 0.5x0.3 smd paste+0 mask+0.035: 2(-0.65,2) 3(-0.65,1.5) 4(-0.65,1) 5(-0.65,0.5) 6(-0.65,0) 7(-0.65,-0.5) 8(-0.65,-1) 9(-0.65,-1.5) 10(-0.65,-2) 11(-0.65,-2.5) 12(0.65,-2.25) 13(0.65,-1.5) 14(0.65,-0.75) 15(0.65,0) 16(0.65,0.75) 17(0.65,1.5) 18(0.65,2.25)
  rect 0.375x0.5 smd paste+0 mask+0.035: EP1(-0.063,1.5) EP2(-0.063,0) EP3(-0.063,-1.5)
Top Layer:
  region: 0.125,-1.25 0.25,-1.375 0.25,-1.625 0.125,-1.75 0.112,-1.735 0.113,-1.262
  region: 0.125,1.75 0.25,1.625 0.25,1.375 0.125,1.25 0.112,1.265 0.113,1.738
  region: 0.125,0.25 0.25,0.125 0.25,-0.125 0.125,-0.25 0.112,-0.235 0.113,0.238
Top Overlay:
  circle w0.25: c-1.5,2.6 r0.125
  lines w0.2: -0.2,-3 1,-3 1,-2.7 ; -0.2,3 1,3 1,2.7
Top Solder:
  region: 0.16,-1.215 0.287,-1.342 0.288,-1.657 0.16,-1.785 0.138,-1.785 0.138,-1.215
  region: 0.16,1.785 0.287,1.658 0.288,1.343 0.16,1.215 0.138,1.215 0.138,1.785
  region: 0.16,0.285 0.287,0.158 0.288,-0.157 0.16,-0.285 0.138,-0.285 0.138,0.285
Top Assy:
  circle w0.05: c-0.4,2.4 r0.175
  lines w0.05: -0.75,-2.597 -0.775,-2.597 -0.775,-2.397 -0.75,-2.397 ; -0.75,-2.097 -0.775,-2.097 -0.775,-1.897 -0.75,-1.897 ; -0.75,-1.597 -0.775,-1.597 -0.775,-1.397 -0.75,-1.397 ; -0.75,-1.097 -0.775,-1.097 -0.775,-0.897 -0.75,-0.897 ; -0.75,-0.597 -0.775,-0.597 -0.775,-0.397 -0.75,-0.397 ; -0.75,-0.097 -0.775,-0.097 -0.775,0.103 -0.75,0.103 ; -0.75,0.403 -0.775,0.403 -0.775,0.603 -0.75,0.603 ; -0.75,0.903 -0.775,0.903 -0.775,1.103 -0.75,1.103 ; -0.75,1.403 -0.775,1.403 -0.775,1.603 -0.75,1.603 ; -0.75,1.903 -0.775,1.903 -0.775,2.103 -0.75,2.103 ; -0.75,2.403 -0.775,2.403 -0.775,2.603 -0.75,2.603 ; -0.55,2.75 -0.55,2.775 -0.45,2.775 -0.45,2.75 ; 0.75,-2.35 0.775,-2.35 0.775,-2.15 0.75,-2.15 ; 0.75,-1.6 0.775,-1.6 0.775,-1.4 0.75,-1.4 ; 0.75,-0.85 0.775,-0.85 0.775,-0.65 0.75,-0.65 ; 0.75,-0.1 0.775,-0.1 0.775,0.1 0.75,0.1 ; 0.75,0.65 0.775,0.65 0.775,0.85 0.75,0.85 ; 0.75,1.4 0.775,1.4 0.775,1.6 0.75,1.6 ; 0.75,2.15 0.775,2.15 0.775,2.35 0.75,2.35 ; -0.75,-2.75 0.75,-2.75 0.75,2.75 -0.75,2.75 -0.75,-2.75
  text ".Designator" at 0.28,-2.064 h1.2
Top Text:
  lines w0.1: -0.5,0 0.5,0 ; 0,-0.5 0,0.5
3D body "UDFN18.STEP": height 0.6, standoff 0, extent -0.775,-2.75 0.775,2.775

## UDFN-08 [mm] "UDFN-08, 8-Leads, Body 1.85x1.00mm, Pitch 0.50mm, IPC Medium Density"
height 0.43
pads (8):
  rect 0.8x0.25 smd paste+0 mask+0.05: 1(-0.545,0.75)
  rrect30% 0.8x0.25 smd paste+0 mask+0.05: 2(-0.545,0.25) 3(-0.545,-0.25) 4(-0.545,-0.75) 5(0.545,-0.75) 6(0.545,-0.25) 7(0.545,0.25) 8(0.545,0.75)
Top Overlay:
  circle w0.1: c-1.05,1.175 r0.05
  lines w0.2: -0.725,-1.075 -0.725,-1.25 0.725,-1.25 0.725,-1.075 ; -0.725,1.075 -0.725,1.25 0.725,1.25 0.725,1.075
Top Assy:
  circle w0.05: c-0.4,0.8 r0.1
  lines w0.05: -0.6,-0.85 -0.68,-0.85 -0.68,-0.65 -0.6,-0.65 ; -0.6,-0.35 -0.68,-0.35 -0.68,-0.15 -0.6,-0.15 ; -0.6,0.15 -0.68,0.15 -0.68,0.35 -0.6,0.35 ; -0.6,0.65 -0.68,0.65 -0.68,0.85 -0.6,0.85 ; 0.6,-0.85 0.68,-0.85 0.68,-0.65 0.6,-0.65 ; 0.6,-0.35 0.68,-0.35 0.68,-0.15 0.6,-0.15 ; 0.6,0.15 0.68,0.15 0.68,0.35 0.6,0.35 ; 0.6,0.65 0.68,0.65 0.68,0.85 0.6,0.85 ; -0.6,-1.05 0.6,-1.05 0.6,1.05 -0.6,1.05 -0.6,-1.05
  text ".Designator" at 0.233,-1.719 h1
Top Text:
  lines w0.05: -1.105,-1.3 1.105,-1.3 1.105,1.3 -1.105,1.3 -1.105,-1.3
  lines w0.1: -0.5,0 0.5,0 ; 0,-0.5 0,0.5
3D body "SON50P100X43-8N.step": height 0.43, standoff 0, extent -0.6,-1.05 0.6,1.05

## US8 [mm]
height 0.6
pads (8):
  rect 0.7x0.3 smd paste+0 mask+0.05: 1(-1.35,0.75)
  oval 0.7x0.3 smd paste+0 mask+0.05: 2(-1.35,0.25) 3(-1.35,-0.25) 4(-1.35,-0.75) 5(1.35,-0.75) 6(1.35,-0.25) 7(1.35,0.25) 8(1.35,0.75)
Top Overlay:
  circle w0.25: c-1.337,1.375 r0.125
  lines w0.2: -0.975,-1.075 0.95,-1.075 ; -0.85,1.05 0.95,1.05
Top Assy:
  circle w0.05: c-0.918,0.782 r0.084
  lines w0.05: -1.15,-0.85 -1.25,-0.85 ; -1.15,-0.65 -1.25,-0.65 ; -1.15,-0.35 -1.25,-0.35 ; -1.15,-0.15 -1.25,-0.15 ; -1.15,0.15 -1.25,0.15 ; -1.15,0.35 -1.25,0.35 ; -1.15,0.65 -1.25,0.65 ; -1.15,0.85 -1.25,0.85 ; 1.15,-0.85 1.25,-0.85 ; 1.15,-0.65 1.25,-0.65 ; 1.15,-0.35 1.25,-0.35 ; 1.15,-0.15 1.25,-0.15 ; 1.15,0.15 1.25,0.15 ; 1.15,0.35 1.25,0.35 ; 1.15,0.65 1.25,0.65 ; 1.15,0.85 1.25,0.85 ; -1.45,-0.85 -1.45,-0.65 ; -1.45,-0.85 -1.55,-0.85 -1.55,-0.65 -1.45,-0.65 ; -1.45,-0.85 -1.42,-0.85 ; -1.45,-0.65 -1.42,-0.65 ; -1.45,-0.35 -1.45,-0.15 ; -1.45,-0.35 -1.55,-0.35 -1.55,-0.15 -1.45,-0.15 ; -1.45,-0.35 -1.42,-0.35 ; -1.45,-0.15 -1.42,-0.15 ; -1.45,0.15 -1.45,0.35 ; -1.45,0.15 -1.55,0.15 -1.55,0.35 -1.45,0.35 ; -1.45,0.15 -1.42,0.15 ; -1.45,0.35 -1.42,0.35 ; -1.45,0.65 -1.55,0.65 -1.55,0.85 -1.45,0.85 ; -1.45,0.65 -1.42,0.65 ; -1.45,0.65 -1.45,0.85 ; -1.45,0.85 -1.42,0.85 ; -1.42,-0.85 -1.42,-0.65 ; -1.42,-0.85 -1.377,-0.85 ; -1.42,-0.65 -1.377,-0.65 ; -1.42,-0.35 -1.42,-0.15 ; -1.42,-0.35 -1.377,-0.35 ; -1.42,-0.15 -1.377,-0.15 ; -1.42,0.15 -1.42,0.35 ; -1.42,0.15 -1.377,0.15 ; -1.42,0.35 -1.377,0.35 ; -1.42,0.65 -1.377,0.65 ; -1.42,0.65 -1.42,0.85 ; -1.42,0.85 -1.377,0.85 ; -1.377,-0.85 -1.377,-0.65 ; -1.377,-0.85 -1.25,-0.85 ; -1.377,-0.65 -1.25,-0.65 ; -1.377,-0.35 -1.377,-0.15 ; -1.377,-0.35 -1.25,-0.35 ; -1.377,-0.15 -1.25,-0.15 ; -1.377,0.15 -1.377,0.35 ; -1.377,0.15 -1.25,0.15 ; -1.377,0.35 -1.25,0.35 ; -1.377,0.65 -1.377,0.85 ; -1.377,0.65 -1.25,0.65 ; -1.377,0.85 -1.25,0.85 ; -1.25,-0.85 -1.25,-0.65 ; -1.25,-0.35 -1.25,-0.15 ; -1.25,0.15 -1.25,0.35 ; -1.25,0.65 -1.25,0.85 ; -1.15,-0.95 ccw(c-1.1,-0.95) -1.1,-1 ; -1.15,-0.95 -1.1,-0.95 ; -1.15,-0.95 -1.15,0.95 ; -1.15,0.95 cw(c-1.1,0.95) -1.1,1 ; -1.15,0.95 -1.1,0.95 ; -1.1,-1 -1.1,-0.95 ; -1.1,-1 1.1,-1 ; -1.1,-0.95 -1.1,0.95 ; -1.1,-0.95 1.1,-0.95 ; -1.1,0.95 -1.1,1 ; -1.1,0.95 1.1,0.95 ; -1.1,1 1.1,1 ; 1.1,-1 ccw(c1.1,-0.95) 1.15,-0.95 ; 1.1,-1 1.1,-0.95 ; 1.1,-0.95 1.15,-0.95 ; 1.1,-0.95 1.1,0.95 ; 1.1,0.95 1.1,1 ; 1.1,0.95 1.15,0.95 ; 1.1,1 cw(c1.1,0.95) 1.15,0.95 ; 1.15,-0.95 1.15,0.95 ; 1.25,-0.85 1.25,-0.65 ; 1.25,-0.85 1.377,-0.85 ; 1.25,-0.65 1.377,-0.65 ; 1.25,-0.35 1.25,-0.15 ; 1.25,-0.35 1.377,-0.35 ; 1.25,-0.15 1.377,-0.15 ; 1.25,0.15 1.25,0.35 ; 1.25,0.15 1.377,0.15 ; 1.25,0.35 1.377,0.35 ; 1.25,0.65 1.377,0.65 ; 1.25,0.65 1.25,0.85 ; 1.25,0.85 1.377,0.85 ; 1.377,-0.85 1.42,-0.85 ; 1.377,-0.85 1.377,-0.65 ; 1.377,-0.65 1.42,-0.65 ; 1.377,-0.35 1.42,-0.35 ; 1.377,-0.35 1.377,-0.15 ; 1.377,-0.15 1.42,-0.15 ; 1.377,0.15 1.377,0.35 ; 1.377,0.15 1.42,0.15 ; 1.377,0.35 1.42,0.35 ; 1.377,0.65 1.42,0.65 ; 1.377,0.65 1.377,0.85 ; 1.377,0.85 1.42,0.85 ; 1.42,-0.85 1.42,-0.65 ; 1.42,-0.85 1.45,-0.85 ; 1.42,-0.65 1.45,-0.65 ; 1.42,-0.35 1.42,-0.15 ; 1.42,-0.35 1.45,-0.35 ; 1.42,-0.15 1.45,-0.15 ; 1.42,0.15 1.42,0.35 ; 1.42,0.15 1.45,0.15 ; 1.42,0.35 1.45,0.35 ; 1.42,0.65 1.45,0.65 ; 1.42,0.65 1.42,0.85 ; 1.42,0.85 1.45,0.85 ; 1.45,-0.85 1.45,-0.65 ; 1.45,-0.85 1.55,-0.85 1.55,-0.65 1.45,-0.65 ; 1.45,-0.35 1.45,-0.15 ; 1.45,-0.35 1.55,-0.35 1.55,-0.15 1.45,-0.15 ; 1.45,0.15 1.45,0.35 ; 1.45,0.15 1.55,0.15 1.55,0.35 1.45,0.35 ; 1.45,0.65 1.55,0.65 1.55,0.85 1.45,0.85 ; 1.45,0.65 1.45,0.85
  text ".Designator" at -1.719,-0.233 h1
Top Text:
  lines w0.1: -0.5,0 0.5,0 ; 0,-0.5 0,0.5
3D body "User Library-US-8-1.STEP": height 0.71, standoff 0.01, extent -1.55,-1 1.55,1